# Altium footprint library sun_library.PcbLib: 412 footprints (part 3 of 26)
Each footprint in its own frame and in the unit in brackets; x right, y up, seen from the top. Pads: shape width x height; smd on the part's side, far side on the other; paste and mask are expansions set on the pad; w line width, h text height; cw(c..) or ccw(c..) is an arc to the next point about the centre after c.
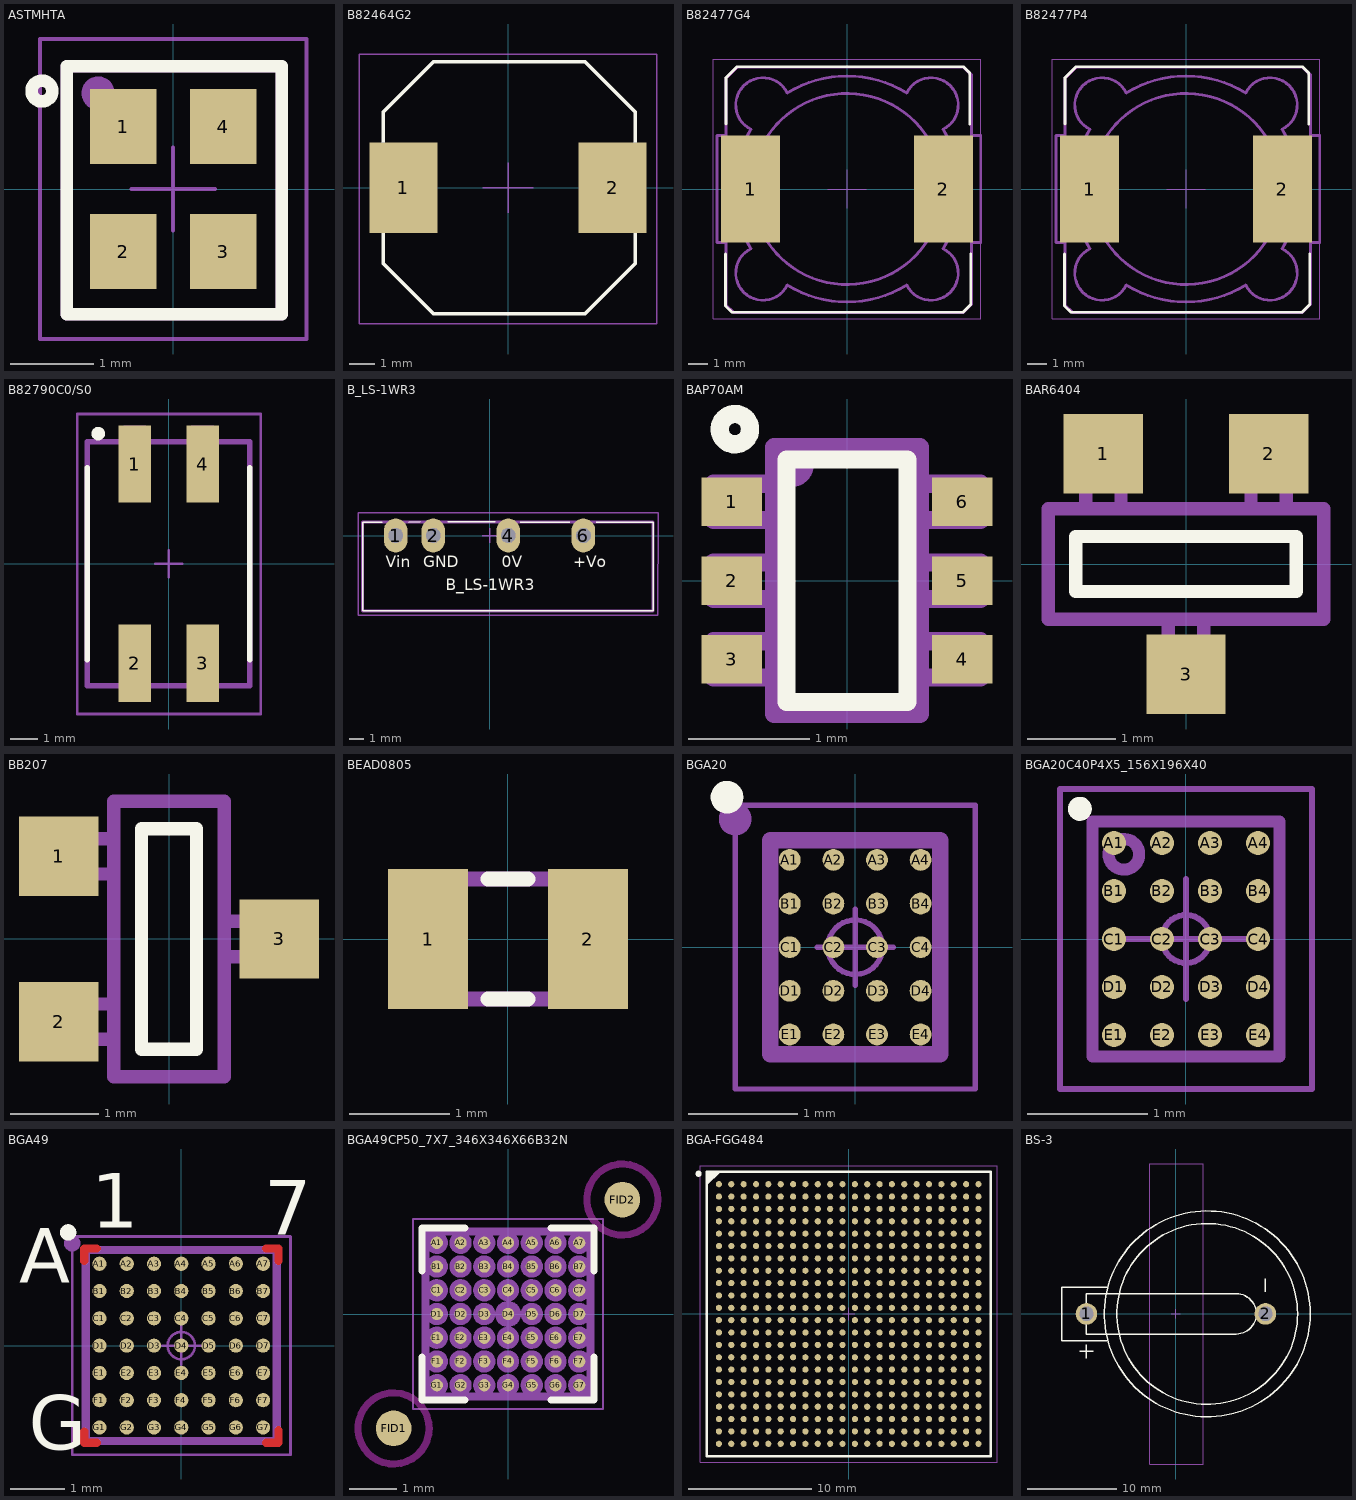
[diagram p2: the footprints below, top view; thin cyan lines are the x and y axes]

## ASTMHTA [mm] "Quartz Crystal, SM; 4 Leads; Body 2.0 x 1.6 x 0.75mm (LxWxH)"
height 0.75
pads (4):
  rect 0.8x0.9 smd: 1(-0.6,0.75) 2(-0.6,-0.75) 3(0.6,-0.75) 4(0.6,0.75)
Top Overlay:
  circle w0.15: c-1.575,1.175 r0.125
  lines w0.15: -1.275,-1.5 -1.275,1.475 1.3,1.475 1.3,-1.5 -1.275,-1.5
TopAssy 13:
  circle w0.15: c-0.9,1.15 r0.125
  lines w0.15: -1.275,-1.5 1.3,-1.5 1.3,1.475 -1.275,1.475 -1.275,-1.5
CourtTop 15:
  lines w0.05: -0.5,0 0.5,0 ; 0,-0.5 0,0.5 ; -1.6,-1.8 1.6,-1.8 1.6,1.8 -1.6,1.8 -1.6,-1.8
3D body "ASA.STEP": height 0.7, standoff 0, extent -0.775,-1.025 0.825,0.975

## B82464G2 [mm] "SMT power inductors, B82464G2 series"
height 3
pads (2):
  rect 2.7x3.6 smd: 1(-4.15,0) 2(4.15,0)
Top Overlay:
  lines w0.15: -4.95,-3 -2.95,-5 ; -4.95,-3 -2.95,-5 ; -4.95,-3 -4.95,3 ; -4.95,3 -2.95,5 ; -4.95,3 -2.95,5 ; -2.95,-5 3.05,-5 ; -2.95,5 3.05,5 ; 3.05,-5 5.05,-3 ; 3.05,-5 5.05,-3 ; 3.05,-5 3.05,-5 ; 3.05,5 5.05,3 ; 3.05,5 5.05,3 ; 5.05,-3 5.05,3 ; 5.05,3 5.05,3
CourtTop 15:
  lines w0.05: -1,0 1,0 ; 0,-1 0,1 ; -5.9,-5.4 -5.9,5.3 5.9,5.3 5.9,-5.4 -5.9,-5.4
3D body: height 3, standoff 0, extent -4.95,-5 5.05,5

## B82477G4 [mm] "SMT power inductors, B82477G4series"
height 8
pads (2):
  rect 3.1x5.6 smd paste-2: 1(-5.05,0) 2(5.05,0)
Top Overlay:
  lines w0.15: -6.35,-3.4 -6.35,-6.125 -6.025,-6.45 6.075,-6.45 6.475,-6.05 6.475,-3.4 ; -6.325,3.4 -6.325,5.825 -5.75,6.4 6.1,6.4 6.425,6.075 6.425,3.4
Top Paste:
  rectangle: -6.6,0.275 -3.5,2.8
  region: -3.5,-0.275 -6.6,-0.275 -6.6,-2.8 -3.5,-2.8
  region: 6.6,-0.275 3.5,-0.275 3.5,-2.8 6.6,-2.8
  rectangle: 3.5,0.275 6.6,2.8
TopAssy 13:
  circle w0.15: c0,0 r5
  lines w0.15: -6.325,-2.8 -6.8,-2.8 -6.8,2.8 -6.325,2.8 ; 6.5,-2.8 7,-2.8 7,2.8 6.5,2.8 ; -6.325,-6.075 -5.925,-6.475 6.063,-6.475 6.525,-6.013 6.525,5.95 6.1,6.375 -5.75,6.375 -6.325,5.8 -6.325,-6.075 ; -5.029,-3.118 cw(c0,0) -5.029,3.118 cw(c-4.396,4.396) -3.118,5.029 cw(c0,0) 3.118,5.029 cw(c4.396,4.396) 5.029,3.118 cw(c0,0) 5.029,-3.118 cw(c4.396,-4.396) 3.118,-5.029 cw(c0,0) -3.118,-5.029 cw(c-4.396,-4.396) -5.029,-3.118
CourtTop 15:
  lines w0.05: -1,0 1,0 ; 0,-1 0,1 ; -7,-6.8 7,-6.8 7,6.8 -7,6.8 -7,-6.8
3D body "User Library-b82477g4.step": height 8, standoff 0, extent -6.325,-6.4 6.475,6.4

## B82477P4 [mm] "SMT power inductors, B82477P4series"
height 8
pads (2):
  rect 3.1x5.6 smd paste-2: 1(-5.05,0) 2(5.05,0)
Top Overlay:
  lines w0.15: -6.35,-3.4 -6.35,-6.125 -6.025,-6.45 6.075,-6.45 6.475,-6.05 6.475,-3.4 ; -6.325,3.4 -6.325,5.825 -5.75,6.4 6.1,6.4 6.425,6.075 6.425,3.4
Top Paste:
  rectangle: -6.6,0.275 -3.5,2.8
  region: -3.5,-0.275 -6.6,-0.275 -6.6,-2.8 -3.5,-2.8
  region: 6.6,-0.275 3.5,-0.275 3.5,-2.8 6.6,-2.8
  rectangle: 3.5,0.275 6.6,2.8
TopAssy 13:
  circle w0.15: c0,0 r5
  lines w0.15: -6.325,-2.8 -6.8,-2.8 -6.8,2.8 -6.325,2.8 ; 6.5,-2.8 7,-2.8 7,2.8 6.5,2.8 ; -6.325,-6.075 -5.925,-6.475 6.063,-6.475 6.525,-6.013 6.525,5.95 6.1,6.375 -5.75,6.375 -6.325,5.8 -6.325,-6.075 ; -5.029,-3.118 cw(c0,0) -5.029,3.118 cw(c-4.396,4.396) -3.118,5.029 cw(c0,0) 3.118,5.029 cw(c4.396,4.396) 5.029,3.118 cw(c0,0) 5.029,-3.118 cw(c4.396,-4.396) 3.118,-5.029 cw(c0,0) -3.118,-5.029 cw(c-4.396,-4.396) -5.029,-3.118
CourtTop 15:
  lines w0.05: -1,0 1,0 ; 0,-1 0,1 ; -7,-6.8 7,-6.8 7,6.8 -7,6.8 -7,-6.8
3D body "User Library-b82477g4.step": height 8, standoff 0, extent -6.325,-6.4 6.475,6.4

## B82790C0/S0 [mm] "B82790C0/S0"
height 5.2
pads (4):
  rect 1.2x2.85 smd: 1(-1.25,3.675) 2(-1.25,-3.675) 3(1.25,-3.675) 4(1.25,3.675)
Top Overlay:
  circle w0.25: c-2.6,4.8 r0.125
  lines w0.2: -3,-3.55 -3,3.55 ; 3,-3.55 3,3.55
TopAssy 13:
  lines w0.2: -3,-4.5 -3,4.5 3,4.5 3,-4.5 -3,-4.5 ; -1.625,-5 -1.625,-3.55 -0.875,-3.55 -0.875,-5 -1.625,-5 ; -1.625,3.55 -1.625,5 -0.875,5 -0.875,3.55 -1.625,3.55 ; 0.875,-5 0.875,-3.55 1.625,-3.55 1.625,-5 0.875,-5 ; 0.875,3.55 0.875,5 1.625,5 1.625,3.55 0.875,3.55
CourtTop 15:
  lines w0.1: -0.5,0 0.5,0 ; 0,-0.5 0,0.5 ; -3.375,-5.55 3.4,-5.55 3.4,5.525 -3.375,5.525 -3.375,-5.55
3D body "User Library-EPCOS B82790-S513-N201.step": height 5.1, standoff -0.05, extent -3,-4.5 3,4.5

## B_LS-1WR3 [mm]
pads (4):
  oval 1.6x2.3 hole 1: 1(-6.35,0) 2(-3.81,0) 4(1.27,0) 6(6.35,0)
Top Overlay:
  lines w0.1: -7.274,0.91 -8.582,0.91 -8.582,-5.109 11.068,-5.109 11.068,0.91 7.233,0.91 ; -5.481,0.91 -4.704,0.915 ; -2.84,0.923 0.398,0.923 ; 2.07,0.91 5.416,0.91
  text "Vin" at -7.034,-2.164 h0.76
  text "GND" at -4.494,-2.164 h0.76
  text "0V" at 0.84,-2.164 h0.76
  text "+Vo" at 5.666,-2.164 h0.76
  text "B_LS-1WR3" at -2.97,-3.688 h0.76
TopAssy 13:
  circle w0.2: c-6.35,0 r0.43
  circle w0.2: c-3.81,0 r0.43
  circle w0.2: c1.27,0 r0.43
  circle w0.2: c6.35,0 r0.43
  lines w0.2: -8.582,-5.109 -8.582,0.923 11.068,0.923 11.068,-5.109 -8.582,-5.109
CourtTop 15:
  lines w0.1: -0.5,0 0.5,0 ; 0,-0.5 0,0.5 ; -8.9,-5.4 11.4,-5.4 11.4,1.543 -8.9,1.543 -8.9,-5.4
3D body "B-LS-1WR3.stp": height 10.16, standoff -4.1, extent -8.582,-5.109 11.068,0.891

## BAP70AM [mm]
pads (6):
  rect 0.5x0.4 smd: 1(-0.95,0.65) 2(-0.95,0) 3(-0.95,-0.65) 4(0.95,-0.65) 5(0.95,0) 6(0.95,0.65)
Top Overlay:
  circle w0.15: c-0.925,1.25 r0.125
  lines w0.15: -0.5,-1 0.5,-1 0.5,1 -0.5,1 -0.5,-1
TopAssy 13:
  circle w0.15: c-0.45,0.95 r0.1
  lines w0.15: -0.6,-0.8 -1.1,-0.8 -1.1,-0.5 -0.6,-0.5 ; -0.6,-0.15 -1.1,-0.15 -1.1,0.15 -0.6,0.15 ; -0.6,0.5 -1.1,0.5 -1.1,0.8 -0.6,0.8 ; 0.6,-0.8 1.1,-0.8 1.1,-0.5 0.6,-0.5 ; 0.6,-0.15 1.1,-0.15 1.1,0.15 0.6,0.15 ; 0.6,0.5 1.1,0.5 1.1,0.8 0.6,0.8 ; -0.6,-1.1 0.6,-1.1 0.6,1.1 -0.6,1.1 -0.6,-1.1
3D body "SOT363.step": height 0.95, standoff -0.04, extent -1.1,-0.95 1,1.05

## BAR6404 [mm]
pads (3):
  rect 0.9x0.9 smd: 1(-0.938,1.25) 2(0.937,1.25) 3(0,-1.25)
Top Overlay:
  lines w0.15: -1.25,-0.312 -1.25,0.313 1.25,0.313 1.25,-0.312 -1.25,-0.312
TopAssy 13:
  lines w0.15: -1.138,0.625 -1.138,1.25 -0.738,1.25 -0.738,0.625 ; -0.2,-0.625 -0.2,-1.25 0.2,-1.25 0.2,-0.625 ; 0.737,0.625 0.737,1.25 1.137,1.25 1.137,0.625 ; -1.563,-0.625 -1.563,0.625 1.562,0.625 1.562,-0.625 -1.563,-0.625

## BB207 [mm]
pads (3):
  rect 0.9x0.9 smd: 1(-1.25,0.937) 2(-1.25,-0.938) 3(1.25,0)
Top Overlay:
  lines w0.15: -0.313,-1.25 0.312,-1.25 0.312,1.25 -0.313,1.25 -0.313,-1.25
TopAssy 13:
  lines w0.15: -0.625,-1.138 -1.25,-1.138 -1.25,-0.738 -0.625,-0.738 ; -0.625,0.737 -1.25,0.737 -1.25,1.137 -0.625,1.137 ; 0.625,-0.2 1.25,-0.2 1.25,0.2 0.625,0.2 ; -0.625,-1.563 0.625,-1.563 0.625,1.562 -0.625,1.562 -0.625,-1.563

## BEAD0805 [mm]
pads (2):
  rect 0.8x1.4 smd: 1(-0.8,0) 2(0.8,0)
Top Overlay:
  lines w0.15: -0.2,-0.6 0.2,-0.6 ; -0.2,0.6 0.2,0.6
3DTop 1:
  region: -1,0.6 -0.5,0.6 -0.5,-0.6 -1,-0.6
  region: 0.5,0.6 1,0.6 1,-0.6 0.5,-0.6
TopAssy 13:
  lines w0.15: -1,-0.6 1,-0.6 1,0.6 -1,0.6 -1,-0.6

## BGA20 [mm] "20-Ball WLCSP, 4x5 Array, 0.4mm Pitch, 250 ?m Ball"
height 0.6
pads (20):
  round 0.2 smd mask+0.05: A1(-0.6,0.8) A2(-0.2,0.8) A3(0.2,0.8) A4(0.6,0.8) B1(-0.6,0.4) B2(-0.2,0.4) B3(0.2,0.4) B4(0.6,0.4) C1(-0.6,0) C2(-0.2,0) C3(0.2,0) C4(0.6,0) D1(-0.6,-0.4) D2(-0.2,-0.4) D3(0.2,-0.4) D4(0.6,-0.4) E1(-0.6,-0.8) E2(-0.2,-0.8) E3(0.2,-0.8) E4(0.6,-0.8)
Top Overlay:
  circle w0.15: c-1.175,1.375 r0.075
TopAssy 13:
  circle w0.15: c-1.1,1.175 r0.075
  lines w0.15: -0.78,-0.98 0.78,-0.98 0.78,0.98 -0.78,0.98 -0.78,-0.98
CourtTop 15:
  circle w0.05: c0,0 r0.25
  lines w0.05: -0.35,0 0.35,0 ; 0,-0.35 0,0.35 ; -1.1,-1.3 1.1,-1.3 1.1,1.3 -1.1,1.3 -1.1,-1.3
3D body "WLCSP20_2X1P6_ONS.step": height 0.64, standoff 0, extent -0.775,-0.978 0.775,0.978

## BGA20C40P4X5_156X196X40 [mm] "BGA, 20-Leads, Body 1,56x1,96mmx0,40mm, Pitch 0,40mm"
height 0.4
pads (20):
  round 0.2 smd mask+0.05: A1(-0.6,0.8) A2(-0.2,0.8) A3(0.2,0.8) A4(0.6,0.8) B1(-0.6,0.4) B2(-0.2,0.4) B3(0.2,0.4) B4(0.6,0.4) C1(-0.6,0) C2(-0.2,0) C3(0.2,0) C4(0.6,0) D1(-0.6,-0.4) D2(-0.2,-0.4) D3(0.2,-0.4) D4(0.6,-0.4) E1(-0.6,-0.8) E2(-0.2,-0.8) E3(0.2,-0.8) E4(0.6,-0.8)
Top Overlay:
  circle w0.1: c-0.885,1.085 r0.05
TopAssy 13:
  circle w0.1: c-0.518,0.706 r0.128
  lines w0.1: -0.78,-0.98 -0.78,0.98 0.78,0.98 0.78,-0.98 -0.78,-0.98
CourtTop 15:
  circle w0.05: c0,0 r0.2
  lines w0.05: -0.5,0 0.5,0 ; 0,-0.5 0,0.5 ; -1.05,-1.25 -1.05,1.25 1.05,1.25 1.05,-1.25 -1.05,-1.25
3D body "BGA20C40P4X5_156X196X40.step": height 0.4, standoff 0, extent -0.78,-0.98 0.78,0.98

## BGA49 [mm] "49-Ball Wafer Level Chip Scale Package WLCSP"
height 0.6
pads (49):
  round 0.26 smd mask+0.05: A1(-1.5,1.5) A2(-1,1.5) A3(-0.5,1.5) A4(0,1.5) A5(0.5,1.5) A6(1,1.5) A7(1.5,1.5) B1(-1.5,1) B2(-1,1) B3(-0.5,1) B4(0,1) B5(0.5,1) B6(1,1) B7(1.5,1) C1(-1.5,0.5) C2(-1,0.5) C3(-0.5,0.5) C4(0,0.5) C5(0.5,0.5) C6(1,0.5) C7(1.5,0.5) D1(-1.5,0) D2(-1,0) D3(-0.5,0) D4(0,0) D5(0.5,0) D6(1,0) D7(1.5,0) E1(-1.5,-0.5) E2(-1,-0.5) E3(-0.5,-0.5) E4(0,-0.5) E5(0.5,-0.5) E6(1,-0.5) E7(1.5,-0.5) F1(-1.5,-1) F2(-1,-1) F3(-0.5,-1) F4(0,-1) F5(0.5,-1) F6(1,-1) F7(1.5,-1) G1(-1.5,-1.5) G2(-1,-1.5) G3(-0.5,-1.5) G4(0,-1.5) G5(0.5,-1.5) G6(1,-1.5) G7(1.5,-1.5)
Top:
  lines w0.15: -1.78,-1.575 -1.78,-1.78 -1.55,-1.78 ; -1.78,1.55 -1.78,1.78 -1.55,1.78 ; 1.55,-1.78 1.78,-1.78 1.78,-1.55 ; 1.55,1.78 1.78,1.78 1.78,1.55
Top Overlay:
  circle w0.15: c-2.075,2.075 r0.075
  text "A" at -2.975,1.15 h1
  text "G" at -2.794,-1.905 h1
  text "1" at -1.651,2.159 h1
  text "7" at 1.524,2.032 h1
Top Solder:
  lines w0.15: -1.78,-1.675 -1.78,-1.78 -1.675,-1.78 ; -1.78,1.675 -1.78,1.78 -1.675,1.78 ; 1.675,-1.78 1.78,-1.78 1.78,-1.675 ; 1.675,1.78 1.78,1.78 1.78,1.675
TopAssy 13:
  circle w0.15: c-2,1.875 r0.075
  lines w0.15: -1.75,-1.75 1.75,-1.75 1.75,1.75 -1.75,1.75 -1.75,-1.75
  text "G" at -2.85,-2 h1.92
  text "A" at -3.125,1.025 h1.92
  text "1" at -1.775,2.075 h1.92
  text "7" at 1.575,2.025 h1.92
CourtTop 15:
  circle w0.05: c0,0 r0.25
  lines w0.05: -0.35,0 0.35,0 ; 0,-0.35 0,0.35 ; -2,-2 2,-2 2,2 -2,2 -2,-2
3D body "BGA49CP50_7X7_346X346X66B32.STEP": height 0.61, standoff -0.05, extent -1.73,-1.73 1.73,1.73

## BGA49CP50_7X7_346X346X66B32N [mm] "Ball Grid Array (BGA), 0.50 mm pitch, square; 49 pin, 3.46 mm L X 3.46 mm W X 0.66 mm H body"
height 0.66
pads (51):
  round 0.26 smd: A1(-1.5,1.5) A2(-1,1.5) A3(-0.5,1.5) A4(0,1.5) A5(0.5,1.5) A6(1,1.5) A7(1.5,1.5) B1(-1.5,1) B2(-1,1) B3(-0.5,1) B4(0,1) B5(0.5,1) B6(1,1) B7(1.5,1) C1(-1.5,0.5) C2(-1,0.5) C3(-0.5,0.5) C4(0,0.5) C5(0.5,0.5) C6(1,0.5) C7(1.5,0.5) D1(-1.5,0) D2(-1,0) D3(-0.5,0) D4(0,0) D5(0.5,0) D6(1,0) D7(1.5,0) E1(-1.5,-0.5) E2(-1,-0.5) E3(-0.5,-0.5) E4(0,-0.5) E5(0.5,-0.5) E6(1,-0.5) E7(1.5,-0.5) F1(-1.5,-1) F2(-1,-1) F3(-0.5,-1) F4(0,-1) F5(0.5,-1) F6(1,-1) F7(1.5,-1) G1(-1.5,-1.5) G2(-1,-1.5) G3(-0.5,-1.5) G4(0,-1.5) G5(0.5,-1.5) G6(1,-1.5) G7(1.5,-1.5)
  round 0.75 smd paste-0.75 mask+0.375: FID1(-2.41,-2.41) FID2(2.41,2.41)
Top keep-out:
  circle w0.15: c2.41,2.41 r0.75
  circle w0.15: c-2.41,-2.41 r0.75
Top Overlay:
  lines w0.15: -1.81,-0.905 -1.81,-1.81 -0.905,-1.81 ; -1.81,0.905 -1.81,1.81 -0.905,1.81 ; 0.905,-1.81 1.81,-1.81 1.81,-0.905 ; 0.905,1.81 1.81,1.81 1.81,0.905
Mechanical 12:
  circle w0.15: c1.5,-1.5 r0.16
  circle w0.15: c1,-1.5 r0.16
  circle w0.15: c0.5,-1.5 r0.16
  circle w0.15: c0,-1.5 r0.16
  circle w0.15: c-0.5,-1.5 r0.16
  circle w0.15: c-1,-1.5 r0.16
  circle w0.15: c-1.5,-1.5 r0.16
  circle w0.15: c1.5,-1 r0.16
  circle w0.15: c1,-1 r0.16
  circle w0.15: c0.5,-1 r0.16
  circle w0.15: c0,-1 r0.16
  circle w0.15: c-0.5,-1 r0.16
  circle w0.15: c-1,-1 r0.16
  circle w0.15: c-1.5,-1 r0.16
  circle w0.15: c1.5,-0.5 r0.16
  circle w0.15: c1,-0.5 r0.16
  circle w0.15: c0.5,-0.5 r0.16
  circle w0.15: c0,-0.5 r0.16
  circle w0.15: c-0.5,-0.5 r0.16
  circle w0.15: c-1,-0.5 r0.16
  circle w0.15: c-1.5,-0.5 r0.16
  circle w0.15: c1.5,0 r0.16
  circle w0.15: c1,0 r0.16
  circle w0.15: c0.5,0 r0.16
  circle w0.15: c0,0 r0.16
  circle w0.15: c-0.5,0 r0.16
  circle w0.15: c-1,0 r0.16
  circle w0.15: c-1.5,0 r0.16
  circle w0.15: c1.5,0.5 r0.16
  circle w0.15: c1,0.5 r0.16
  circle w0.15: c0.5,0.5 r0.16
  circle w0.15: c0,0.5 r0.16
  circle w0.15: c-0.5,0.5 r0.16
  circle w0.15: c-1,0.5 r0.16
  circle w0.15: c-1.5,0.5 r0.16
  circle w0.15: c1.5,1 r0.16
  circle w0.15: c1,1 r0.16
  circle w0.15: c0.5,1 r0.16
  circle w0.15: c0,1 r0.16
  circle w0.15: c-0.5,1 r0.16
  circle w0.15: c-1,1 r0.16
  circle w0.15: c-1.5,1 r0.16
  circle w0.15: c1.5,1.5 r0.16
  circle w0.15: c1,1.5 r0.16
  circle w0.15: c0.5,1.5 r0.16
  circle w0.15: c0,1.5 r0.16
  circle w0.15: c-0.5,1.5 r0.16
  circle w0.15: c-1,1.5 r0.16
  circle w0.15: c-1.5,1.5 r0.16
  lines w0.15: -1.73,-1.73 -1.73,1.73 1.73,1.73 1.73,-1.73 -1.73,-1.73
TopAssy 13:
  lines w0.15: -1.75,-1.75 -1.75,1.75 1.75,1.75 1.75,-1.75 -1.75,-1.75
CourtTop 15:
  circle w0.05: c0,0 r0.25
  lines w0.05: -0.35,0 0.35,0 ; 0,-0.35 0,0.35 ; -2,-2 -2,2 2,2 2,-2 -2,-2
3D body "BGA49CP50_7X7_346X346X66B32.STEP": height 0.66, standoff 0, extent -1.73,-1.73 1.73,1.73

## BGA-FGG484 [mm] "BGA, 484-Balls, Body 23x23mm, Pitch 1mm"
height 2.6
pads (484):
  round 0.5 smd mask+0.102: A1(-10.5,10.5) A2(-9.5,10.5) A3(-8.5,10.5) A4(-7.5,10.5) A5(-6.5,10.5) A6(-5.5,10.5) A7(-4.5,10.5) A8(-3.5,10.5) A9(-2.5,10.5) A10(-1.5,10.5) A11(-0.5,10.5) A12(0.5,10.5) A13(1.5,10.5) A14(2.5,10.5) A15(3.5,10.5) A16(4.5,10.5) A17(5.5,10.5) A18(6.5,10.5) A19(7.5,10.5) A20(8.5,10.5) A21(9.5,10.5) A22(10.5,10.5) AA1(-10.5,-9.5) AA2(-9.5,-9.5) AA3(-8.5,-9.5) AA4(-7.5,-9.5) AA5(-6.5,-9.5) AA6(-5.5,-9.5) AA7(-4.5,-9.5) AA8(-3.5,-9.5) AA9(-2.5,-9.5) AA10(-1.5,-9.5) AA11(-0.5,-9.5) AA12(0.5,-9.5) AA13(1.5,-9.5) AA14(2.5,-9.5) AA15(3.5,-9.5) AA16(4.5,-9.5) AA17(5.5,-9.5) AA18(6.5,-9.5) AA19(7.5,-9.5) AA20(8.5,-9.5) AA21(9.5,-9.5) AA22(10.5,-9.5) AB1(-10.5,-10.5) AB2(-9.5,-10.5) AB3(-8.5,-10.5) AB4(-7.5,-10.5) AB5(-6.5,-10.5) AB6(-5.5,-10.5) AB7(-4.5,-10.5) AB8(-3.5,-10.5) AB9(-2.5,-10.5) AB10(-1.5,-10.5) AB11(-0.5,-10.5) AB12(0.5,-10.5) AB13(1.5,-10.5) AB14(2.5,-10.5) AB15(3.5,-10.5) AB16(4.5,-10.5) AB17(5.5,-10.5) AB18(6.5,-10.5) AB19(7.5,-10.5) AB20(8.5,-10.5) AB21(9.5,-10.5) AB22(10.5,-10.5) B1(-10.5,9.5) B2(-9.5,9.5) B3(-8.5,9.5) B4(-7.5,9.5) B5(-6.5,9.5) B6(-5.5,9.5) B7(-4.5,9.5) B8(-3.5,9.5) B9(-2.5,9.5) B10(-1.5,9.5) B11(-0.5,9.5) B12(0.5,9.5) B13(1.5,9.5) B14(2.5,9.5) B15(3.5,9.5) B16(4.5,9.5) B17(5.5,9.5) B18(6.5,9.5) B19(7.5,9.5) B20(8.5,9.5) B21(9.5,9.5) B22(10.5,9.5) C1(-10.5,8.5) C2(-9.5,8.5) C3(-8.5,8.5) C4(-7.5,8.5) C5(-6.5,8.5) C6(-5.5,8.5) C7(-4.5,8.5) C8(-3.5,8.5) C9(-2.5,8.5) C10(-1.5,8.5) C11(-0.5,8.5) C12(0.5,8.5) C13(1.5,8.5) C14(2.5,8.5) C15(3.5,8.5) C16(4.5,8.5) C17(5.5,8.5) C18(6.5,8.5) C19(7.5,8.5) C20(8.5,8.5) C21(9.5,8.5) C22(10.5,8.5) D1(-10.5,7.5) D2(-9.5,7.5) D3(-8.5,7.5) D4(-7.5,7.5) D5(-6.5,7.5) D6(-5.5,7.5) D7(-4.5,7.5) D8(-3.5,7.5) D9(-2.5,7.5) D10(-1.5,7.5) D11(-0.5,7.5) D12(0.5,7.5) D13(1.5,7.5) D14(2.5,7.5) D15(3.5,7.5) D16(4.5,7.5) D17(5.5,7.5) D18(6.5,7.5) D19(7.5,7.5) D20(8.5,7.5) D21(9.5,7.5) D22(10.5,7.5) E1(-10.5,6.5) E2(-9.5,6.5) E3(-8.5,6.5) E4(-7.5,6.5) E5(-6.5,6.5) E6(-5.5,6.5) E7(-4.5,6.5) E8(-3.5,6.5) E9(-2.5,6.5) E10(-1.5,6.5) E11(-0.5,6.5) E12(0.5,6.5) E13(1.5,6.5) E14(2.5,6.5) E15(3.5,6.5) E16(4.5,6.5) E17(5.5,6.5) E18(6.5,6.5) E19(7.5,6.5) E20(8.5,6.5) E21(9.5,6.5) E22(10.5,6.5) F1(-10.5,5.5) F2(-9.5,5.5) F3(-8.5,5.5) F4(-7.5,5.5) F5(-6.5,5.5) F6(-5.5,5.5) F7(-4.5,5.5) F8(-3.5,5.5) F9(-2.5,5.5) F10(-1.5,5.5) F11(-0.5,5.5) F12(0.5,5.5) F13(1.5,5.5) F14(2.5,5.5) F15(3.5,5.5) F16(4.5,5.5) F17(5.5,5.5) F18(6.5,5.5) F19(7.5,5.5) F20(8.5,5.5) F21(9.5,5.5) F22(10.5,5.5) G1(-10.5,4.5) G2(-9.5,4.5) G3(-8.5,4.5) G4(-7.5,4.5) G5(-6.5,4.5) G6(-5.5,4.5) G7(-4.5,4.5) G8(-3.5,4.5) G9(-2.5,4.5) G10(-1.5,4.5) G11(-0.5,4.5) G12(0.5,4.5) G13(1.5,4.5) G14(2.5,4.5) G15(3.5,4.5) G16(4.5,4.5) G17(5.5,4.5) G18(6.5,4.5) G19(7.5,4.5) G20(8.5,4.5) G21(9.5,4.5) G22(10.5,4.5) H1(-10.5,3.5) H2(-9.5,3.5) H3(-8.5,3.5) H4(-7.5,3.5) H5(-6.5,3.5) H6(-5.5,3.5) H7(-4.5,3.5) H8(-3.5,3.5) H9(-2.5,3.5) H10(-1.5,3.5) H11(-0.5,3.5) H12(0.5,3.5) H13(1.5,3.5) H14(2.5,3.5) H15(3.5,3.5) H16(4.5,3.5) H17(5.5,3.5) H18(6.5,3.5) H19(7.5,3.5) H20(8.5,3.5) H21(9.5,3.5) H22(10.5,3.5) J1(-10.5,2.5) J2(-9.5,2.5) J3(-8.5,2.5) J4(-7.5,2.5) J5(-6.5,2.5) J6(-5.5,2.5) J7(-4.5,2.5) J8(-3.5,2.5) J9(-2.5,2.5) J10(-1.5,2.5) J11(-0.5,2.5) J12(0.5,2.5) J13(1.5,2.5) J14(2.5,2.5) J15(3.5,2.5) J16(4.5,2.5) J17(5.5,2.5) J18(6.5,2.5) J19(7.5,2.5) J20(8.5,2.5) J21(9.5,2.5) J22(10.5,2.5) K1(-10.5,1.5) K2(-9.5,1.5) K3(-8.5,1.5) K4(-7.5,1.5) K5(-6.5,1.5) K6(-5.5,1.5) K7(-4.5,1.5) K8(-3.5,1.5) K9(-2.5,1.5) K10(-1.5,1.5) K11(-0.5,1.5) K12(0.5,1.5) K13(1.5,1.5) K14(2.5,1.5) K15(3.5,1.5) K16(4.5,1.5) K17(5.5,1.5) K18(6.5,1.5) K19(7.5,1.5) K20(8.5,1.5) K21(9.5,1.5) K22(10.5,1.5) L1(-10.5,0.5) L2(-9.5,0.5) L3(-8.5,0.5) L4(-7.5,0.5) L5(-6.5,0.5) L6(-5.5,0.5) L7(-4.5,0.5) L8(-3.5,0.5) L9(-2.5,0.5) L10(-1.5,0.5) L11(-0.5,0.5) L12(0.5,0.5) L13(1.5,0.5) L14(2.5,0.5) L15(3.5,0.5) L16(4.5,0.5) L17(5.5,0.5) L18(6.5,0.5) L19(7.5,0.5) L20(8.5,0.5) L21(9.5,0.5) L22(10.5,0.5) M1(-10.5,-0.5) M2(-9.5,-0.5) M3(-8.5,-0.5) M4(-7.5,-0.5) M5(-6.5,-0.5) M6(-5.5,-0.5) M7(-4.5,-0.5) M8(-3.5,-0.5) M9(-2.5,-0.5) M10(-1.5,-0.5) M11(-0.5,-0.5) M12(0.5,-0.5) M13(1.5,-0.5) M14(2.5,-0.5) M15(3.5,-0.5) M16(4.5,-0.5) M17(5.5,-0.5) M18(6.5,-0.5) M19(7.5,-0.5) M20(8.5,-0.5) M21(9.5,-0.5) M22(10.5,-0.5) N1(-10.5,-1.5) N2(-9.5,-1.5) N3(-8.5,-1.5) N4(-7.5,-1.5) N5(-6.5,-1.5) N6(-5.5,-1.5) N7(-4.5,-1.5) N8(-3.5,-1.5) N9(-2.5,-1.5) N10(-1.5,-1.5) N11(-0.5,-1.5) N12(0.5,-1.5) N13(1.5,-1.5) N14(2.5,-1.5) N15(3.5,-1.5) N16(4.5,-1.5) N17(5.5,-1.5) N18(6.5,-1.5) N19(7.5,-1.5) N20(8.5,-1.5) N21(9.5,-1.5) N22(10.5,-1.5) P1(-10.5,-2.5) P2(-9.5,-2.5) P3(-8.5,-2.5) P4(-7.5,-2.5) P5(-6.5,-2.5) P6(-5.5,-2.5) P7(-4.5,-2.5) P8(-3.5,-2.5) P9(-2.5,-2.5) P10(-1.5,-2.5) P11(-0.5,-2.5) P12(0.5,-2.5) P13(1.5,-2.5) P14(2.5,-2.5) P15(3.5,-2.5) P16(4.5,-2.5) P17(5.5,-2.5) P18(6.5,-2.5) P19(7.5,-2.5) P20(8.5,-2.5) P21(9.5,-2.5) P22(10.5,-2.5) R1(-10.5,-3.5) R2(-9.5,-3.5) R3(-8.5,-3.5) R4(-7.5,-3.5) R5(-6.5,-3.5) R6(-5.5,-3.5) R7(-4.5,-3.5) R8(-3.5,-3.5) R9(-2.5,-3.5) R10(-1.5,-3.5) R11(-0.5,-3.5) R12(0.5,-3.5) R13(1.5,-3.5) R14(2.5,-3.5) R15(3.5,-3.5) R16(4.5,-3.5) R17(5.5,-3.5) R18(6.5,-3.5) R19(7.5,-3.5) R20(8.5,-3.5) R21(9.5,-3.5) R22(10.5,-3.5) T1(-10.5,-4.5) T2(-9.5,-4.5) T3(-8.5,-4.5) T4(-7.5,-4.5) T5(-6.5,-4.5) T6(-5.5,-4.5) T7(-4.5,-4.5) T8(-3.5,-4.5) T9(-2.5,-4.5) T10(-1.5,-4.5) T11(-0.5,-4.5) T12(0.5,-4.5) T13(1.5,-4.5) T14(2.5,-4.5) T15(3.5,-4.5) T16(4.5,-4.5) T17(5.5,-4.5) T18(6.5,-4.5) T19(7.5,-4.5) T20(8.5,-4.5) T21(9.5,-4.5) T22(10.5,-4.5) U1(-10.5,-5.5) U2(-9.5,-5.5) U3(-8.5,-5.5) U4(-7.5,-5.5) U5(-6.5,-5.5) U6(-5.5,-5.5) U7(-4.5,-5.5) U8(-3.5,-5.5) U9(-2.5,-5.5) U10(-1.5,-5.5) U11(-0.5,-5.5) U12(0.5,-5.5) U13(1.5,-5.5) U14(2.5,-5.5) U15(3.5,-5.5) U16(4.5,-5.5) U17(5.5,-5.5) U18(6.5,-5.5) U19(7.5,-5.5) U20(8.5,-5.5) U21(9.5,-5.5) U22(10.5,-5.5) V1(-10.5,-6.5) V2(-9.5,-6.5) V3(-8.5,-6.5) V4(-7.5,-6.5) V5(-6.5,-6.5) V6(-5.5,-6.5) V7(-4.5,-6.5) V8(-3.5,-6.5) V9(-2.5,-6.5) V10(-1.5,-6.5) V11(-0.5,-6.5) V12(0.5,-6.5) V13(1.5,-6.5) V14(2.5,-6.5) V15(3.5,-6.5) V16(4.5,-6.5) V17(5.5,-6.5) V18(6.5,-6.5) V19(7.5,-6.5) V20(8.5,-6.5) V21(9.5,-6.5) V22(10.5,-6.5) W1(-10.5,-7.5) W2(-9.5,-7.5) W3(-8.5,-7.5) W4(-7.5,-7.5) W5(-6.5,-7.5) W6(-5.5,-7.5) W7(-4.5,-7.5) W8(-3.5,-7.5) W9(-2.5,-7.5) W10(-1.5,-7.5) W11(-0.5,-7.5) W12(0.5,-7.5) W13(1.5,-7.5) W14(2.5,-7.5) W15(3.5,-7.5) W16(4.5,-7.5) W17(5.5,-7.5) W18(6.5,-7.5) W19(7.5,-7.5) W20(8.5,-7.5) W21(9.5,-7.5) W22(10.5,-7.5) Y1(-10.5,-8.5) Y2(-9.5,-8.5) Y3(-8.5,-8.5) Y4(-7.5,-8.5) Y5(-6.5,-8.5) Y6(-5.5,-8.5) Y7(-4.5,-8.5) Y8(-3.5,-8.5) Y9(-2.5,-8.5) Y10(-1.5,-8.5) Y11(-0.5,-8.5) Y12(0.5,-8.5) Y13(1.5,-8.5) Y14(2.5,-8.5) Y15(3.5,-8.5) Y16(4.5,-8.5) Y17(5.5,-8.5) Y18(6.5,-8.5) Y19(7.5,-8.5) Y20(8.5,-8.5) Y21(9.5,-8.5) Y22(10.5,-8.5)
Top Overlay:
  circle w0.25: c-12.15,11.35 r0.125
  region: -10.5,11.5 -11.5,10.5 -11.5,11.5
  lines w0.2: -11.5,10.5 -10.5,11.5 ; -11.5,-11.5 -11.5,11.5 11.5,11.5 11.5,-11.5 -11.5,-11.5
TopAssy 13:
  lines w0.1: -11.5,-11.5 11.5,-11.5 11.5,11.5 -11.5,11.5 -11.5,-11.5
CourtTop 15:
  lines w0.05: -12,-12 12,-12 12,12 -12,12 -12,-12
  lines w0.1: -0.5,0 0.5,0 ; 0,-0.5 0,0.5
3D body "User Library-FBGA484.step": height 2.5, standoff 0, extent -11.5,-11.5 11.5,11.5

## BS-3 [mm]
pads (2):
  round 2.41 hole 1.6: 1(-10,0) 2(10,0)
Top Overlay:
  circle w0.15: c3.5,0 r10.1
  circle w0.15: c3.5,0 r11.5
  lines w0.15: -10.75,-4.2 -9.25,-4.2 ; -10,-4.95 -10,-3.45 ; -7.75,-3 -12.75,-3 -12.75,3 -7.75,3 ; 10,2.45 10,3.95 ; -10,-2.25 6.75,-2.25 ccw(c6.75,0) 6.75,2.25 -10,2.25 -10,-2.25
CourtTop 15:
  lines w0.05: -0.5,0 0.5,0 ; 0,-0.5 0,0.5 ; -2.925,-16.775 -2.925,16.75 3.025,16.75 3.025,-16.775 -2.925,-16.775